# Altium integrated library Lib_MS_V4.0.IntLib: 296 symbols (part 2 of 2)
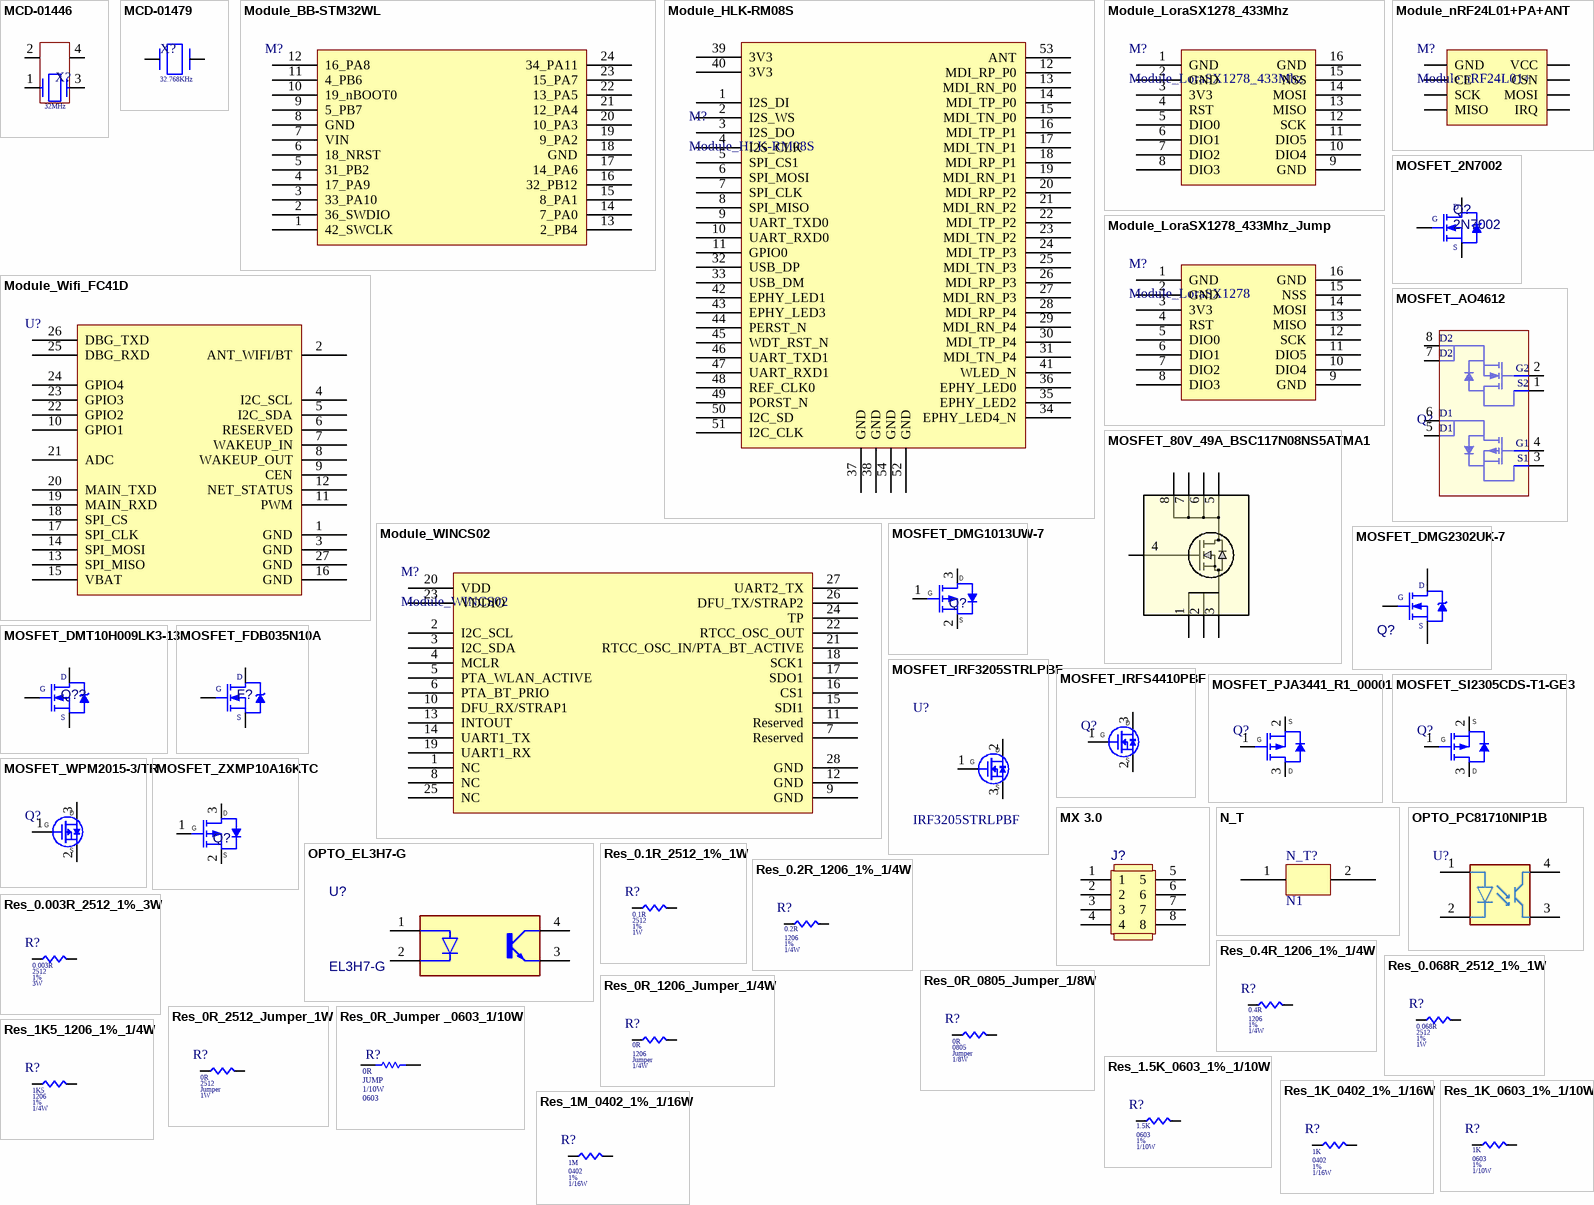
[diagram p10: symbols MCD-01446 to Res_1M_0402_1%_1/16W]

## Module_LoraSX1278_433Mhz
designator M?
Module RF SPI Lora SX1278 433MHz Ra-02 Ai-Thinker; ComponentLink1Description: CXT; ComponentLink1URL: https://linhkien.cxtvn.com/3446-module-wireless-sx1278-lora-ra-02-433mhz.html
footprint Module_LoraSX1278_433Mhz
pins: 1 GND, 2 GND, 3 3V3, 4 RST, 5 DIO0, 6 DIO1, 7 DIO2, 8 DIO3, 9 GND, 10 DIO4, 11 DIO5, 12 SCK, 13 MISO, 14 MOSI, 15 NSS, 16 GND

## Module_LoraSX1278_433Mhz_Jump
designator M?, comment Module_LoraSX1278
Module RF SPI Lora SX1278 433MHz Ra-02 Ai-Thinker with PCB; ComponentLink1Description: CXT; ComponentLink1URL: https://linhkien.cxtvn.com/11214-sx1278-lora-ra-02-ai-thinker-module-thu-phat-rf-spi-433mhz.html/page-1
footprint Module_LoraSX1278_433Mhz_JUMP
pins: 1 GND, 2 GND, 3 3V3, 4 RST, 5 DIO0, 6 DIO1, 7 DIO2, 8 DIO3, 9 GND, 10 DIO4, 11 DIO5, 12 SCK, 13 MISO, 14 MOSI, 15 NSS, 16 GND

## Module_nRF24L01+PA+ANT
designator M?, comment Module nRF24L01+
ComponentLink1Description: New link; ComponentLink1URL: https://lkcg.vn/mach-thu-phat-rf-nrf24l01-pa-lna-2-4ghz-anten-roi
footprint Module_nRF24L01+PA+ANT
pins: 1 GND, 2 VCC, 3 CE, 4 CSN, 5 SCK, 6 MOSI, 7 MISO, 8 IRQ

## Module_Wifi_FC41D
designator U?, comment FC41D  (value not drawn)
Wi-Fi & Bluetooth Module FC41D; ComponentLink1Description: DIGIKEY; ComponentLink1URL: https://www.digikey.com/en/products/detail/quectel/FC41DAHMD/21272527
footprint Module_Wifi_FC41D
pins: 1 GND, 2 ANT_WIFI/BT, 3 GND, 4 I2C_SCL, 5 I2C_SDA, 6 RESERVED, 7 WAKEUP_IN, 8 WAKEUP_OUT, 9 CEN, 10 GPIO1, 11 PWM, 12 NET_STATUS, 13 SPI_MISO, 14 SPI_MOSI, 15 VBAT, 16 GND, 17 SPI_CLK, 18 SPI_CS, 19 MAIN_RXD, 20 MAIN_TXD, 21 ADC, 22 GPIO2, 23 GPIO3, 24 GPIO4, 25 DBG_RXD, 26 DBG_TXD, 27 GND

## Module_WINCS02
designator M?
WiFi 802.11b/g/n Transceiver Module 2.4GHz Antenna Not Included, U.FL Surface Mount; ComponentLink1Description: New link; ComponentLink1URL: https://www.digikey.com/en/products/detail/microchip-technology/WINCS02UE-I-100/24617252
footprint MODULE_WINCS02UE
pins: 1 NC, 2 I2C_SCL, 3 I2C_SDA, 4 MCLR, 5 PTA_WLAN_ACTIVE, 6 PTA_BT_PRIO, 7 Reserved, 8 NC, 9 GND, 10 DFU_RX/STRAP1, 11 Reserved, 12 GND, 13 INTOUT, 14 UART1_TX, 15 SDI1, 16 CS1, 17 SDO1, 18 SCK1, 19 UART1_RX, 20 VDD, 21 RTCC_OSC_IN/PTA_BT_ACTIVE, 22 RTCC_OSC_OUT, 23 VDDIO, 24 TP, 25 NC, 26 DFU_TX/STRAP2, 27 UART2_TX, 28 GND

## MOSFET_2N7002
designator Q?, comment 2N7002
N-Channel 60 V 115mA (Ta) 200mW (Ta) Surface Mount SOT-23-3; Manufacturer: DIODES INC.; Part Number: 2N7002-7-F; Vdss: 60 V; Rds On (Max) @ Id, Vgs: 7.5Ohm @ 500mA, 10V; Package: SOT23-3; ComponentLink1Description: TGIC; ComponentLink1URL: https://www.thegioiic.com/2n7002-mosfet-kenh-n-60v-115ma-sot-23; ComponentLink2Description: DIGIKEY; ComponentLink2URL: https://www.digikey.bg/en/products/detail/onsemi/2N7002/244345; Id: 115mA; Sort: N-Channel
footprint MOSFET_2N7002_SOT-23-3
pins: 1 G, 2 S, 3 D

## MOSFET_80V_49A_BSC117N08NS5ATMA1
designator Q?, comment BSC117N08NS5ATMA1  (value not drawn)
N-Channel 80 V 49A (Tc) 2.5W (Ta), 50W (Tc) Surface Mount PG-TDSON-8-7; Manufacturer: Infineon; VDS: 80V; ComponentLink1Description: DIGIKEY; ComponentLink1URL: https://www.digikey.com/en/products/detail/infineon-technologies/BSC117N08NS5ATMA1/5959917; Id Max: 49A; Sort: N-Channel; Package: TDSON-8-7; Parameter 1: *
footprint MOSFET_BSC117N08NS5ATMA1
pins: 1, 2, 3, 4, 5, 6, 7, 8

## MOSFET_AO4612
designator Q?, comment AO4612  (value not drawn)
MOSFET N/P-CH 60V 4.5A 8SOIC; Manufacturer: Alpha & Omega Semiconductor Inc.; ComponentLink1Description: LKCL; ComponentLink1URL: https://linhkienchatluong.vn/fets/ao4612-dual-mosfet-np-60v-sop-8-chinh-hang-aos_sp589_ct15568.aspx; Part Number: AO4612; Vds: 60V; Id Max: 4.5A; Sort: N/P-CH; Package: 8-SOIC
footprint AO4612
pins: 1 S2, 2 G2, 3 S1, 4 G1, 5 D1, 6 D1, 7 D2, 8 D2

## MOSFET_DMG1013UW-7
designator Q?, comment DMG1013UW-7  (value not drawn)
P-Channel 20 V 820mA (Ta) 310mW (Ta) Surface Mount SOT-323; Manufacturer: DIODES INC.; Description SEL: MOSFET P-CH 20V 820MA SOT323; Vdss: 20V; Rds On (Max) @ Id, Vgs: 750mOhm @ 430mA, 4.5V; Gate Charge (Qg) (Max) @ Vgs: 0.622 nC @ 4.5 V; Part Number: DMG1013UW-7; Package: SOT-323; ComponentLink1Description: DIGIKEY; ComponentLink1URL: https://www.digikey.bg/en/products/detail/diodes-incorporated/DMG1013UW-7/2183241?s=N4IgTCBcDaICIFkDiBGADCgzAVQOoFoB2EAXQF8g; Id: 820mA; Sort: P-Channel
footprint MOSFET_DMG1013UW-7_SOT323
pins: 1 GATE, 2 SOURCE, 3 DRAIN
text: D; G; S

## MOSFET_DMG2302UK-7
designator Q?, comment DMG2302UK-7  (value not drawn)
MOSFET N-CH 20V 2.8A SOT23; Manufacturer: DIODE INC.; Sort: N-Channel; Rds On (Max) @ Id, Vgs: 90mOhm @ 3.6A, 4.5V; Qg Max: 2.8 nC @ 10 V; Part Number: DMG2302UK-7; Package: SOT23; Vds: 20V; ComponentLink1Description: New link; ComponentLink1URL: *; Id Max: 2.8A
footprint MOSFET_DMG2302UK-7
pins: 1 G, 2 S, 3 D

## MOSFET_DMT10H009LK3-13
designator Q??, comment DMT10H009LK3-13  (value not drawn)
N-Channel 100 V 90A (Tc) 1.7W (Ta) Surface Mount TO-252 (DPAK); Manufacturer: Diodes Incorporated; Voltage: 100V; Rds On (Max) @ Id, Vgs: 9mOhm @ 20A, 10V; Gate Charge (Qg) (Max) @ Vgs: 20 nC @ 4.5 V; Part Number: DMT10H009LK3-13; Current: 90A; Package: TO-252-3; Type: N-Channel; ComponentLink1Description: DIGIKEY; ComponentLink1URL: https://www.digikey.com/en/products/detail/diodes-incorporated/DMT10H009LK3-13/16547500?s=N4IgTCBcDaICIFkAqBGADACTWgnAGQGkBmAWhSJAF0BfIA
footprint MOSFET_DMT10H009LK3-13
pins: 1 G, 2 D, 3 S

## MOSFET_FDB035N10A
designator F?, comment FDB035N10A  (value not drawn)
N-Channel 100 V 120A (Tc) 333W (Tc) Surface Mount TO-263 (D2PAK); Manufacturer: onsemi; Vds: 100V; Rds On (Max) @ Id, Vgs: 3.5mOhm @ 75A, 10V; Gate Charge (Qg) (Max) @ Vgs: 116 nC @ 10 V; Part Number: FDB035N10A; ComponentLink1Description: DIGIKEY; ComponentLink1URL: https://www.digikey.com/en/products/detail/onsemi/FDB035N10A/2804157?s=N4IgTCBcDaIGIBEBCAGAzAVgHIEYUEEQBdAXyA; Id Max: 120A; Package: TO-263 (D2PAK); Sort: N-Channel
footprint MOSFET_FDB035N10A
pins: 1 G, 2 D, 3 S

## MOSFET_IRF3205STRLPBF
designator U?, comment IRF3205STRLPBF
MOSFET N-CH 55V 110A D2PAK; Manufacture: Infineon Technologies; Sort: N-Channel; Rds On (Max) @ Id, Vgs: 8mOhm @ 62A, 10V; Gate Charge (Qg) (Max) @ Vgs: 146 nC @ 10 V; ComponentLink1Description: LKCG; ComponentLink1URL: https://lkcg.vn/linh-kien-irf3205s-dip-to-220; ComponentLink2Description: DIGIKEY; ComponentLink2URL: https://www.digikey.bg/en/products/detail/infineon-technologies/IRF3205STRLPBF/856540; Manufacture Part Number: IRF3205STRLPBF; MSL: 1; Temperature: -40°C ~ 150°C; Vds: 55 V; Id: 110A
footprint MOSFET_IRF3205S
pins: 1 G, 2 D, 3 S

## MOSFET_IRFS4410PBF
designator Q?, comment IRFS4410PBF  (value not drawn)
N-Channel 100 V 88A (Tc) 200W (Tc) Surface Mount D2PAK; Manufacturer: Infineon Technologies; Vdss: 100 V; Rds On (Max) @ Id, Vgs: 10mOhm @ 58A, 10V; Gate Charge (Qg) (Max) @ Vgs: 180 nC @ 10 V; ComponentLink1Description: ICDR; ComponentLink1URL: https://icdayroi.com/irfs4410pbf; ComponentLink2Description: DIGIKEY; ComponentLink2URL: https://www.digikey.bg/en/products/detail/infineon-technologies/IRFS4410PBF/1827971?s=N4IgTCBcDaIJICUBiBlALGgjABgAoCEkACEAXQF8g; Part Number: IRFS4410PBF; Id: 88A; Sort: N-Channel
footprint MOSFET_IRFS4410PBF
pins: 1 G, 2 S, 3 D

## MOSFET_PJA3441_R1_00001
designator Q?, comment PJA3441_R1_00001  (value not drawn)
P-Channel 40 V 3.1A (Ta) 1.25W (Ta) Surface Mount SOT-23; Manufacturer: Panjit International Inc.; Vdss: 40 V; Rds On (Max) @ Id, Vgs: 88mOhm @ 3.1A, 10V; Gate Charge (Qg) (Max) @ Vgs: 6 nC @ 4.5 V; ComponentLink1Description: New link; ComponentLink1URL: https://www.digikey.bg/en/products/detail/panjit-international-inc/PJA3441-R1-00001/14660323; Part Number: PJA3441_R1_00001; Id: 3.1A; Sort: P-Channel; Package: SOT-23
footprint MOSFET_PJA3441_R1_00001
pins: 1 GATE, 2 SOURCE, 3 DRAIN
text: S; G; D

## MOSFET_SI2305CDS-T1-GE3
designator Q?, comment SI2305CDS-T1-GE3  (value not drawn)
P-Channel 8 V 5.8A (Tc) 960mW (Ta), 1.7W (Tc) Surface Mount SOT-23-3 (TO-236); Manufacturer: Vishay Siliconix; Vdss: 8V; Rds On (Max) @ Id, Vgs: 35mOhm @ 4.4A, 4.5V; Gate Charge (Qg) (Max) @ Vgs: 30 nC @ 8 V; ComponentLink1Description: New link; ComponentLink1URL: https://www.digikey.com/en/products/detail/vishay-siliconix/SI2305CDS-T1-GE3/2622024?s=N4IgTCBcDaIMoEkwGYAMBWAwgETgWgBUBGPAcQFFkQBdAXyA; Part Number: SI2305CDS-T1-GE3; Sort: P-Channel; Id: 5.8A; Package: SOT-23-3 (TO-236)
footprint MOSFET_SI2305CDS-T1-GE3
pins: 1 GATE, 2 SOURCE, 3 DRAIN
text: S; G; D

## MOSFET_WPM2015-3/TR
designator Q?, comment WPM2015-3/TR  (value not drawn)
20V 2.2A 800mW 110mΩ@4.5V,2.7A 810mV@250uA 1 Piece P-Channel SOT-23 MOSFETs ROHS; Manufacturer: WILLSEMI(Will Semicon); Id: 2.4A; Gate Charge(Qg): 7.3nC@4.5V; ComponentLink1Description: New link; ComponentLink1URL: https://jlcpcb.com/partdetail/WILLSEMI_Will_Semicon-WPM2015_3TR/C213159; Part Number: WPM2015-3/TR; Sort: P-Channel; Vdss: 20V; RDS(on): 110mΩ@4.5V,2.7A; Package: SOT-23
footprint MOSFET_WPM2015-3/TR
pins: 1 G, 2 S, 3 D

## MOSFET_ZXMP10A16KTC
designator Q?, comment ZXMP10A16KTC  (value not drawn)
P-Channel 100 V 3A (Ta) 2.15W (Ta) Surface Mount TO-252-3; Manufacturer: DIODES INC.; Part Number: IRFR9120NTRPBF; Vdss: 100V; Rds On (Max) @ Id, Vgs: 235mOhm @ 2.1A, 10V; Gate Charge (Qg) (Max) @ Vgs: 16.5 nC @ 10 V; Package: To252-3p; ComponentLink1Description: DIGIKEY; ComponentLink1URL: https://www.digikey.bg/en/products/detail/diodes-incorporated/ZXMP10A16KTC/1873878?s=N4IgTCBcDaIFoA0CyAFAjABgIJoGwGkAVAYRAF0BfIA; Sort: P-Channel; Id: 3A
footprint MOSFET_ZXMP10A16KTC
pins: 1 GATE, 2 SOURCE, 3 DRAIN
text: D; G; S

## MX 3.0
designator J?, comment 430450800  (value not drawn)
Part Number: MX 3.0mm; Value: RA/8P; Description SEL: Đầu Nối MX 3.0mm; ComponentLink1Description: CXT; ComponentLink1URL: https://linhkien.cxtvn.com/3373-dau-noi-mx30mm-2-hang-chan-duc-cong.html
footprint 430450800
pins: 1, 2, 3, 4, 5, 6, 7, 8

## N_T
designator N_T?, comment N1  (net tie, no BOM)
footprint NT
pins: 1, 2

## OPTO_EL3H7-G
designator U?, comment EL3H7-G
Optoisolator Transistor Output 3750Vrms 1 Channel 4-SSOP; Part Number: VOS617A-4T; Manufacturer: Everlight Electronics; Description SEL: OPTOISOLATOR 3.75KV TRANS 4-SSOP; Current - Output / Channel: 50mA; Voltage - Output (Max): 80V; Number of Channels: 1; ComponentLink1Description: TGIC; ComponentLink1URL: https://www.thegioiic.com/el3h7-optoisolator-transistor-output-3750vrms-1-channel-4-ssop; ComponentLink2Description: DIGIKEY; ComponentLink2URL: https://www.digikey.com/en/products/detail/everlight-electronics-co-ltd/EL3H7-G/2692941; Package: 4-SSOP
footprint OPTO_EL3H7-G
pins: 1 A, 2 C, 3 E, 4 CO

## OPTO_PC81710NIP1B
designator U?, comment PC81710NIP1B  (value not drawn)
OPTOISOLATOR 5KV 1CH TRANS 4-SMD; Manufacturer: SHARP/Socle Technology; Number of Channels: 1; Voltage - Output (Max): 80V; Current - Output / Channel: 50mA; ComponentLink1Description: BLK; ComponentLink1URL: https://banlinhkien.com/el817-sop4-opto-thay-the-pc817-smd-p6650626.html; ComponentLink2Description: DIGIKEY; ComponentLink2URL: https://www.digikey.com/en/products/detail/sharp-socle-technology/PC81710NIP1B/7798258; Part number: PC81710NIP1B; Package: 4-SMD
footprint PC817
pins: 1 ANODE, 2 CATHODE, 3 EMITTER, 4 COLLECTOR

## Res_0.1R_2512_1%_1W
designator R?, comment value 0.1R  Tolerance: 1%  Power: 1W  Package: 2512  (hidden comment: RL2512FK-070R1L)
RES 0.1 OHM 1% 1W 2512; ComponentLink1Description: CXT; ComponentLink1URL: https://linhkien.cxtvn.com/4866-dien-tro-2512-2w-1w-1-cac-gia-tri-day-5-chiec.html; ComponentLink2Description: DIGIKEY; ComponentLink2URL: https://www.digikey.com/en/products/detail/yageo/RL2512FK-070R1L/2827664?s=N4IgTCBcDaIAQCUAyYCsBGMAxA0gWgAYB2AhdJEAXQF8g
footprint Res_2512
pins: 1, 2

## Res_0.2R_1206_1%_1/4W
designator R?, comment value 0.2R  Power: 1/4W  Pakage: 1206  Tolerance: 1%  (hidden comment: WSL1206R2000FEB)
RES 0.2 OHM 1% 1/4W 1206; ComponentLink1Description: CXT; ComponentLink1URL: https://linhkien.cxtvn.com/11466-dien-tro-1206-1-thong-so-tu-0r-den-910r.html; ComponentLink2Description: DIGIKEY; ComponentLink2URL: https://www.digikey.com/en/products/detail/vishay-dale/WSL1206R2000FEB/9752677
footprint Res_1206
pins: 1, 2

## Res_0.003R_2512_1%_3W
designator R?, comment value 0.003R  Tolerance: 1%  Power: 3W  Package: 2512  (hidden comment: CRE2512-FZ-R003E-3)
3 mOhms ±1% 3W Chip Resistor 2512 (6432 Metric) Automotive AEC-Q200, Current Sense, Moisture Resistant Metal Element; ComponentLink1Description: MOUSER; ComponentLink1URL: https://www.mouser.vn/ProductDetail/Bourns/CRE2512-FZ-R003E-3?qs=rpfKl3ntHzPjkfGuk%252BIwsA%3D%3D
footprint Res_2512_3W_CRE2512-FZ-R003E-3
pins: 1, 2

## Res_0.4R_1206_1%_1/4W
designator R?, comment value 0.4R  Power: 1/4W  Pakage: 1206  Tolerance: 1%  (hidden comment: RL1206FR-7W0R4L)
RES 0.4 OHM 1% 1/4W 1206; ComponentLink1Description: MOUSER; ComponentLink1URL: https://www.mouser.vn/ProductDetail/YAGEO/RL1206FR-7W0R4L?qs=k2KEx2DUIRSMzNnaPb%252BF0w%3D%3D
footprint Res_1206
pins: 1, 2

## Res_0.068R_2512_1%_1W
designator R?, comment value 0.068R  Tolerance: 1%  Power: 1W  Package: 2512  (hidden comment: RL2512FK-070R068L)
RES 0.068 OHM 1% 1W 2512; ComponentLink1Description: DIGIKEY; ComponentLink1URL: https://www.digikey.com/en/products/detail/yageo/RL2512FK-070R068L/3885856
footprint Res_2512
pins: 1, 2

## Res_0R_0805_Jumper_1/8W
designator R?, comment value 0R  Tolerance: Jumper  Power: 1/8W  Package: 0805  (hidden comment: RC0805JR-070RL)
RES 0 OHM JUMPER 1/8W 0805; ComponentLink1Description: CXT; ComponentLink1URL: https://linhkien.cxtvn.com/2899-dien-tro-0805-1-thong-so-tu-0r-den-910r.html; ComponentLink2Description: DIGIKEY; ComponentLink2URL: https://www.digikey.com/en/products/detail/yageo/RC0805JR-070RL/728216
footprint Res_0805
pins: 1, 2

## Res_0R_1206_Jumper_1/4W
designator R?, comment value 0R  Power: 1/4W  Pakage: 1206  Tolerance: Jumper  (hidden comment: RC1206JR-070RL)
RES 0 OHM JUMPER 1/4W 1206; ComponentLink1Description: CXT; ComponentLink1URL: https://linhkien.cxtvn.com/3667-dien-tro-1206-1-thong-so-tu-0r-den-910r.html; ComponentLink2Description: DIGIKEY; ComponentLink2URL: https://www.digikey.com/en/products/detail/yageo/RC1206JR-070RL/729184
footprint Res_1206
pins: 1, 2

## Res_0R_2512_Jumper_1W
designator R?, comment value 0R  Tolerance: Jumper  Power: 1W  Package: 2512  (hidden comment: CR2512AJ/-000EAS)
0 Ohms Jumper Chip Resistor 2512 (6432 Metric) Anti-Sulfur, Automotive AEC-Q200, Moisture Resistant Thick Film; ComponentLink1Description: DIGIKEY; ComponentLink1URL: https://www.digikey.bg/en/products/detail/bourns-inc/CR2512AJ-000EAS/10240145?s=N4IgTCBcDaIE4FMDOACADHFYCsBGCAugL5A; ComponentLink2Description: LKD; ComponentLink2URL: https://banlinhkiendientu.vn/dien-tro-dan-2512-0r-r00-1w-5-day-10-chiec/
footprint Res_2512_3W_CRE2512-FZ-R003E-3
pins: 1, 2

## Res_0R_Jumper _0603_1/10W
designator R?, comment Resistance: 0R  Tolerance: JUMP  Power: 1/10W  Package: 0603  (hidden comment: RC0603JR-070RL)
RES 0 OHM JUMPER 1/10W 0603; Manufacture 1: YAGEOWalsin Technology Corporation; Mouting Type: SMD; Temp Coef: ±100ppm/°C; Manufacture Part Number 1: RC0603JR-070RL; MSL: 1; Temperature: -55°C ~ 155°C; Type: RES; ComponentLink1Description: CXT; ComponentLink1URL: https://linhkien.cxtvn.com/3833-dien-tro-0603-1-thong-so-tu-0r-den-910r.html; ComponentLink2Description: DIGIKEY; ComponentLink2URL: https://www.digikey.com/en/products/detail/yageo/RC0603JR-070RL/726675
footprint RESC1608X05N (Chip Resistor, 2-Leads, Body 1.60x0.80mm (0603))
pins: 1, 2

## Res_1.5K_0603_1%_1/10W
designator R?, comment value 1.5K  Power: 1/10W  Package: 0603  Tolerance: 1%  (hidden comment: 0603WAF1501T5E)
RES 1.5K OHM 1% 1/10W 0603; ComponentLink1Description: CXT; ComponentLink1URL: https://linhkien.cxtvn.com/5005-dien-tro-0603-1-thong-so-tu-1k-den-91k.html; ComponentLink2Description: DIGIKEY; ComponentLink2URL: https://www.mouser.vn/ProductDetail/Royalohm/0603WAF1501T5E?qs=e8oIoAS2J1TWOCRo0oO1xg%3D%3D
footprint RESC1608X05N (Chip Resistor, 2-Leads, Body 1.60x0.80mm (0603))
pins: 1, 2

## Res_1K5_1206_1%_1/4W
designator R?, comment value 1K5  Tolerance: 1%  Power: 1/4W  Package: 1206  (hidden comment: CRGCQ1206F1K5)
RES 1.5K OHM 1% 1/4W 1206; ComponentLink2Description: CXT; ComponentLink2URL: https://linhkien.cxtvn.com/3351-dien-tro-1206-5-thong-so-tu-1k-den-91k.html; ComponentLink3Description: DIGIKEY; ComponentLink3URL: https://www.digikey.bg/en/products/detail/te-connectivity-passive-product/CRGCQ1206F1K5/8576414
footprint Res_1206
pins: 1, 2

## Res_1K_0402_1%_1/16W
designator R?, comment value 1K  Power: 1/16W  Tolerance: 1%  Pakage: 0402  (hidden comment: RC0402FR-071KL)
RES 1K OHM 1% 1/16W 0402; ComponentLink1Description: CXT; ComponentLink1URL: https://linhkien.cxtvn.com/3454-dien-tro-0402-1-thong-so-tu-1k-den-91k.html; ComponentLink2Description: DIGIKEY; ComponentLink2URL: https://www.digikey.bg/en/products/detail/yageo/RC0402FR-071KL/726513?s=N4IgTCBcDaIEoGEAMAWJYBicC0SDsAjANIAyIAugL5A
footprint RES_0402
pins: 1, 2

## Res_1K_0603_1%_1/10W
designator R?, comment value 1K  Power: 1/10W  Pakage: 0603  Tolerance: 1%  (hidden comment: RC0603FR-071KL)
RES 1K OHM 1% 1/10W 0603; ComponentLink1Description: New link; ComponentLink1URL: https://linhkien.cxtvn.com/1424-dien-tro-0603-1-thong-so-tu-1k-den-91k.html; ComponentLink2Description: New link 1; ComponentLink2URL: https://www.digikey.bg/en/products/detail/yageo/RC0603FR-071KL/726843
footprint RESC1608X05N (Chip Resistor, 2-Leads, Body 1.60x0.80mm (0603))
pins: 1, 2

## Res_1M_0402_1%_1/16W
designator R?, comment value 1M  Power: 1/16W  Tolerance: 1%  Pakage: 0402  (hidden comment: RC0402FR-071ML)
RES 1M OHM 1% 1/16W 0402; ComponentLink1Description: CXT; ComponentLink1URL: https://linhkien.cxtvn.com/2940-dien-tro-0402-1-thong-so-tu-1m-den-10m.html; ComponentLink2Description: DIGIKEY; ComponentLink2URL: https://www.digikey.bg/en/products/detail/yageo/RC0402FR-071ML/726515
footprint RES_0402
pins: 1, 2

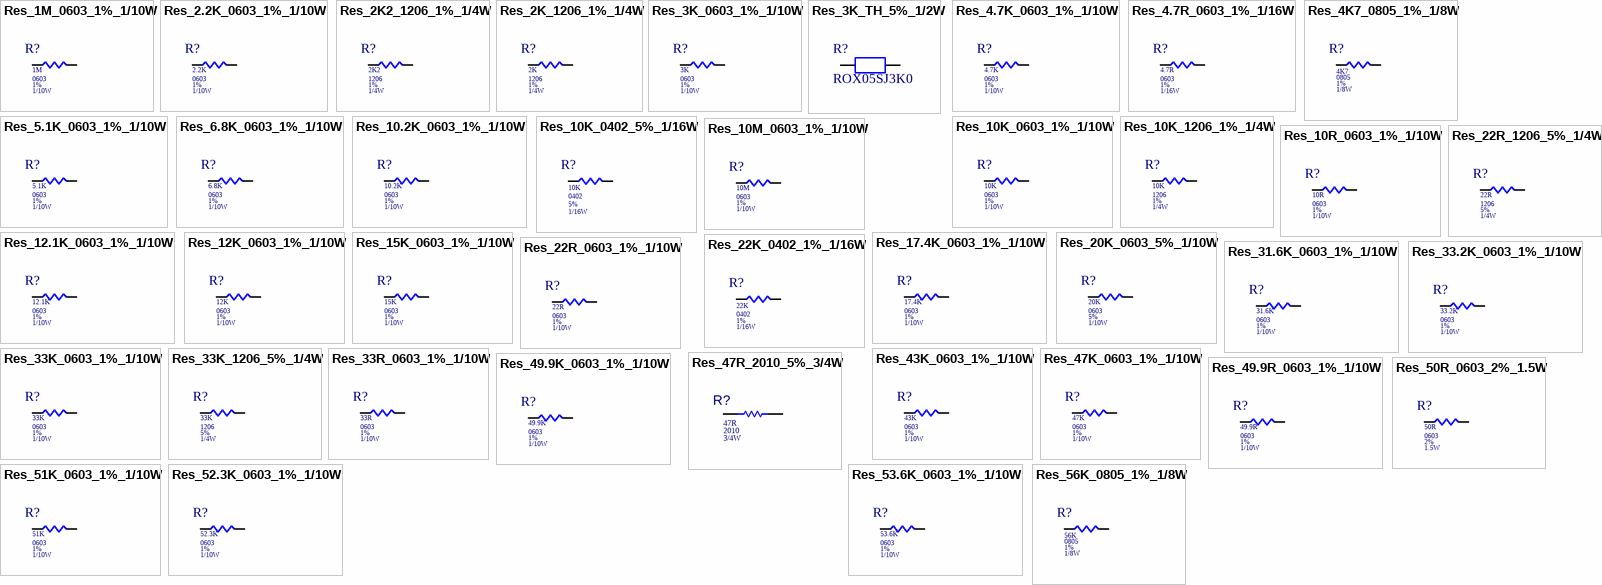
[diagram p7: symbols Res_1M_0603_1%_1/10W to Res_56K_0805_1%_1/8W]

## Res_1M_0603_1%_1/10W
designator R?, comment value 1M  Power: 1/10W  Pakage: 0603  Tolerance: 1%  (hidden comment: RC0603FR-071ML)
RES 1M OHM 1% 1/10W 0603; ComponentLink1Description: CXT; ComponentLink1URL: https://linhkien.cxtvn.com/2390-dien-tro-0603-1-thong-so-tu-1m-den-10m.html; ComponentLink2Description: DIGIKEY; ComponentLink2URL: https://www.digikey.com/en/products/detail/yageo/RC0603FR-071ML/726844
footprint RESC1608X05N (Chip Resistor, 2-Leads, Body 1.60x0.80mm (0603))
pins: 1, 2

## Res_2.2K_0603_1%_1/10W
designator R?, comment value 2.2K  Power: 1/10W  Pakage: 0603  Tolerance: 1%  (hidden comment: RMCF0603FT2K20)
RES 2.2K OHM 1% 1/10W 0603; ComponentLink1Description: CXT; ComponentLink1URL: https://linhkien.cxtvn.com/3649-dien-tro-0603-1-thong-so-tu-1k-den-91k.html; ComponentLink2Description: DIGIKEY; ComponentLink2URL: https://www.digikey.com/en/products/detail/stackpole-electronics-inc/RMCF0603FT2K20/1760987
footprint RESC1608X05N (Chip Resistor, 2-Leads, Body 1.60x0.80mm (0603))
pins: 1, 2

## Res_2K2_1206_1%_1/4W
designator R?, comment value 2K2  Power: 1/4W  Pakage: 1206  Tolerance: 1%  (hidden comment: RMCF1206FT2K20)
RES 2.2K OHM 1% 1/4W 1206; ComponentLink1Description: CXT; ComponentLink1URL: https://linhkien.cxtvn.com/4144-dien-tro-1206-1-thong-so-tu-1k-den-910k.html; ComponentLink2Description: DIGIKEY; ComponentLink2URL: https://www.digikey.bg/en/products/detail/stackpole-electronics-inc/RMCF1206FT2K20/1759713
footprint Res_1206
pins: 1, 2

## Res_2K_1206_1%_1/4W
designator R?, comment value 2K  Power: 1/4W  Pakage: 1206  Tolerance: 1%  (hidden comment: RMCF1206FT2K00)
RES 2K OHM 1% 1/4W 1206; ComponentLink1Description: CXT; ComponentLink1URL: https://linhkien.cxtvn.com/3352-dien-tro-1206-5-thong-so-tu-1k-den-91k.html; ComponentLink2Description: DIGIKEY; ComponentLink2URL: https://www.digikey.bg/en/products/detail/stackpole-electronics-inc/RMCF1206FT2K00/1759723
footprint Res_1206
pins: 1, 2

## Res_3K_0603_1%_1/10W
designator R?, comment value 3K  Power: 1/10W  Pakage: 0603  Tolerance: 1%  (hidden comment: RMCF0603FT3K00)
3 kOhms ±1% 0.1W, 1/10W Chip Resistor 0603 (1608 Metric) Automotive AEC-Q200 Thick Film; ComponentLink1Description: LKCL; ComponentLink1URL: https://linhkienchatluong.vn/dien-tro-dan-0603-116w-1/dien-tro-dan-0603-3k-1-50c_sp836_ct11748.aspx; ComponentLink2Description: DIGIKEY; ComponentLink2URL: https://www.digikey.bg/en/products/detail/stackpole-electronics-inc/RMCF0603FT3K00/1713988
footprint RESC1608X05N (Chip Resistor, 2-Leads, Body 1.60x0.80mm (0603))
pins: 1, 2

## Res_3K_TH_5%_1/2W
designator R?, comment ROX05SJ3K0
3 kOhms ±5% 0.5W, 1/2W Through Hole Resistor Axial Flame Proof, Pulse Withstanding, Safety Metal Oxide Film; Manufacturer: TE Connectivity Passive Product; Value: 3K; Part Number: ROX05SJ3K0; Tolerance: 5%; Power: 1/2W; Dimension: 2.50mm x 7.50mm; ComponentLink1Description: New link; ComponentLink1URL: *; ComponentLink2Description: DIGIKEY; ComponentLink2URL: https://www.digikey.bg/en/products/detail/te-connectivity-passive-product/ROX05SJ3K0/9926141
footprint RES_TH_1/2W
pins: 1, 2

## Res_4.7K_0603_1%_1/10W
designator R?, comment value 4.7K  Power: 1/10W  Pakage: 0603  Tolerance: 1%  (hidden comment: RC0603FR-074K7L)
RES 4.7K OHM 1% 1/10W 0603; ComponentLink1Description: CXT; ComponentLink1URL: https://linhkien.cxtvn.com/2398-dien-tro-0603-1-thong-so-tu-1k-den-91k.html; ComponentLink2Description: DIGIKEY; ComponentLink2URL: https://www.digikey.com/en/products/detail/yageo/RC0603FR-074K7L/727212
footprint RESC1608X05N (Chip Resistor, 2-Leads, Body 1.60x0.80mm (0603))
pins: 1, 2

## Res_4.7R_0603_1%_1/16W
designator R?, comment value 4.7R  Power: 1/16W  Pakage: 0603  Tolerance: 1%  (hidden comment: RN73G1JTD4R70D)
RES SMD_4.7R_0.5%_1/16W, 0.625W; ComponentLink1Description: CXT; ComponentLink1URL: https://linhkien.cxtvn.com/2259-dien-tro-0603-1-thong-so-tu-0r-den-910r.html; ComponentLink2Description: DIGIKEY; ComponentLink2URL: https://www.digikey.com/en/products/detail/meritek/RN73G1JTD4R70D/16549473?s=N4IgTCBcDaIEoFEDKACALAOgOxxQBgDY8BmEAXQF8g
footprint RESC1608X05N (Chip Resistor, 2-Leads, Body 1.60x0.80mm (0603))
pins: 1, 2

## Res_4K7_0805_1%_1/8W
designator R?, comment value 4K7  Tolerance: 1%  Power: 1/8W  Package: 0805  (hidden comment: CRCW08054K70FKEAC)
4.7 kOhms ±1% 0.125W, 1/8W Chip Resistor 0805 (2012 Metric) Thick Film; ComponentLink1Description: CXT; ComponentLink1URL: https://linhkien.cxtvn.com/2349-dien-tro-0805-1-thong-so-tu-1k-den-91k.html; ComponentLink2Description: DIGIKEY; ComponentLink2URL: https://www.digikey.com/en/products/detail/vishay-dale/CRCW08054K70FKEAC/7928553
footprint Res_0805
pins: 1, 2

## Res_5.1K_0603_1%_1/10W
designator R?, comment value 5.1K  Power: 1/10W  Pakage: 0603  Tolerance: 1%  (hidden comment: RMCF0603FT5K10)
5.1 kOhms ±1% 0.1W, 1/10W Chip Resistor 0603 (1608 Metric) Automotive AEC-Q200 Thick Film; ComponentLink1Description: CXT; ComponentLink1URL: https://linhkien.cxtvn.com/2291-dien-tro-0603-1-thong-so-tu-1k-den-91k.html; ComponentLink2Description: DIGIKEY; ComponentLink2URL: https://www.digikey.bg/en/products/detail/stackpole-electronics-inc/RMCF0603FT5K10/1760908?s=N4IgTCBcDaIEoFkDCAxADANjQZhQFQFYBpARjRAF0BfIA
footprint RESC1608X05N (Chip Resistor, 2-Leads, Body 1.60x0.80mm (0603))
pins: 1, 2

## Res_6.8K_0603_1%_1/10W
designator R?, comment value 6.8K  Power: 1/10W  Pakage: 0603  Tolerance: 1%  (hidden comment: RC0603FR-106K8L)
6.8 kOhms ±1% 0.1W, 1/10W Chip Resistor 0603 (1608 Metric) Thick Film; ComponentLink1Description: CXT; ComponentLink1URL: https://linhkien.cxtvn.com/5034-dien-tro-0603-1-thong-so-tu-1k-den-91k.html; ComponentLink2Description: DIGIKEY; ComponentLink2URL: https://www.digikey.bg/en/products/detail/yageo/RC0603FR-106K8L/14008237
footprint RESC1608X05N (Chip Resistor, 2-Leads, Body 1.60x0.80mm (0603))
pins: 1, 2

## Res_10.2K_0603_1%_1/10W
designator R?, comment value 10.2K  Power: 1/10W  Package: 0603  Tolerance: 1%  (hidden comment: RC0603FR-1310K2L)
RES 10.2K OHM 1% 1/10W 0603; ComponentLink1Description: CXT; ComponentLink1URL: https://linhkien.cxtvn.com/4622-dien-tro-0603-1-thong-so-tu-1k-den-91k.html; ComponentLink2Description: DIGIKEY; ComponentLink2URL: https://www.digikey.bg/en/products/detail/yageo/RC0603FR-07560RL/727304
footprint RESC1608X05N (Chip Resistor, 2-Leads, Body 1.60x0.80mm (0603))
pins: 1, 2

## Res_10K_0402_5%_1/16W
designator R?, comment value 10K  Power: 1/16W  Tolerance: 5%  Pakage: 0402  (hidden comment: RC0402JR-0710KL)
RES 10K OHM 5% 1/16W 0402; ComponentLink1Description: CXT; ComponentLink1URL: https://linhkien.cxtvn.com/2824-dien-tro-10k-0402-5-50c.html; ComponentLink2Description: DIGIKEY; ComponentLink2URL: https://www.digikey.com/en/products/detail/yageo/RC0402JR-0710KL/726418
footprint RES_0402
pins: 1, 2

## Res_10K_0603_1%_1/10W
designator R?, comment value 10K  Power: 1/10W  Package: 0603  Tolerance: 1%  (hidden comment: RC0603FR-0710KL)
RES 10K OHM 1% 1/10W 0603; ComponentLink1Description: CXT; ComponentLink1URL: https://linhkien.cxtvn.com/1422-dien-tro-0603-1-thong-so-tu-1k-den-91k.html; ComponentLink2Description: DIGIKEY; ComponentLink2URL: https://www.digikey.com/en/products/detail/yageo/RC0603FR-0710KL/726880?s=N4IgTCBcDaIEoGEAMA2JBmAYnAtEg7AIxIDSAMiALoC%2BQA
footprint RESC1608X05N (Chip Resistor, 2-Leads, Body 1.60x0.80mm (0603))
pins: 1, 2

## Res_10K_1206_1%_1/4W
designator R?, comment value 10K  Power: 1/4W  Pakage: 1206  Tolerance: 1%  (hidden comment: RC1206FR-0710KL)
RES 10K OHM 1% 1/4W 1206; ComponentLink1Description: CXT; ComponentLink1URL: https://linhkien.cxtvn.com/2656-dien-tro-1206-1-thong-so-tu-1k-den-910k.html; ComponentLink2Description: DIGIKEY; ComponentLink2URL: https://www.digikey.bg/en/products/detail/yageo/RC1206FR-0710KL/728483
footprint Res_1206
pins: 1, 2

## Res_10M_0603_1%_1/10W
designator R?, comment value 10M  Power: 1/10W  Pakage: 0603  Tolerance: 1%  (hidden comment: WR06W1005FTL)
10 MOhms ±1% 0.1W, 1/10W Chip Resistor 0603 (1608 Metric) Thick Film; ComponentLink1Description: LKCL; ComponentLink1URL: https://linhkienchatluong.vn/dien-tro-dan-0603-116w-1/dien-tro-dan-0603-10m-1-01f-50c_sp836_ct8446.aspx; ComponentLink2Description: DIGIKEY; ComponentLink2URL: https://www.digikey.bg/en/products/detail/walsin-technology-corporation/WR06W1005FTL/13243162?s=N4IgTCBcDaIOoCUAMA2OBGJSCsAxAKgDIgC6AvkA
footprint RESC1608X05N (Chip Resistor, 2-Leads, Body 1.60x0.80mm (0603))
pins: 1, 2

## Res_10R_0603_1%_1/10W
designator R?, comment value 10R  Power: 1/10W  Pakage: 0603  Tolerance: 1%  (hidden comment: RMCF0603FT10R0)
RES 10 OHM 1% 1/10W 0603; ComponentLink1Description: CXT; ComponentLink1URL: https://linhkien.cxtvn.com/2391-dien-tro-0603-1-thong-so-tu-0r-den-910r.html; ComponentLink2Description: DIGIKEY; ComponentLink2URL: https://www.digikey.com/en/products/detail/stackpole-electronics-inc/RMCF0603FT10R0/1761152
footprint RESC1608X05N (Chip Resistor, 2-Leads, Body 1.60x0.80mm (0603))
pins: 1, 2

## Res_12.1K_0603_1%_1/10W
designator R?, comment value 12.1K  Power: 1/10W  Package: 0603  Tolerance: 1%  (hidden comment: 0603WAF1212T5E)
RES 12.1K OHM 1% 1/10W 0603; ComponentLink1Description: CXT; ComponentLink1URL: https://linhkien.cxtvn.com/7742-dien-tro-0603-1-thong-so-tu-1k-den-91k.html; ComponentLink2Description: MOUSER; ComponentLink2URL: https://www.mouser.vn/ProductDetail/Royalohm/0603WAF1212T5E?qs=e8oIoAS2J1QOf5tSbOLY6A%3D%3D
footprint RESC1608X05N (Chip Resistor, 2-Leads, Body 1.60x0.80mm (0603))
pins: 1, 2

## Res_12K_0603_1%_1/10W
designator R?, comment value 12K  Power: 1/10W  Package: 0603  Tolerance: 1%  (hidden comment: RMCF0603FT12K0)
12 kOhms ±1% 0.1W, 1/10W Chip Resistor 0603 (1608 Metric) Automotive AEC-Q200 Thick Film; ComponentLink1Description: CXT; ComponentLink1URL: https://linhkien.cxtvn.com/4536-dien-tro-0603-1-thong-so-tu-1k-den-91k.html; ComponentLink2Description: DIGIKEY; ComponentLink2URL: https://www.digikey.com/en/products/detail/stackpole-electronics-inc/RMCF0603FT12K0/1761297
footprint RESC1608X05N (Chip Resistor, 2-Leads, Body 1.60x0.80mm (0603))
pins: 1, 2

## Res_15K_0603_1%_1/10W
designator R?, comment value 15K  Power: 1/10W  Pakage: 0603  Tolerance: 1%  (hidden comment: RMCF0603FT15K0)
15 kOhms ±1% 0.1W, 1/10W Chip Resistor 0603 (1608 Metric) Automotive AEC-Q200 Thick Film; ComponentLink1Description: CXT; ComponentLink1URL: https://linhkien.cxtvn.com/7715-dien-tro-0603-1-thong-so-tu-1k-den-91k.html; ComponentLink2Description: DIGIKEY; ComponentLink2URL: https://www.digikey.bg/en/products/detail/stackpole-electronics-inc/RMCF0603FT15K0/1760774
footprint RESC1608X05N (Chip Resistor, 2-Leads, Body 1.60x0.80mm (0603))
pins: 1, 2

## Res_17.4K_0603_1%_1/10W
designator R?, comment value 17.4K  Power: 1/10W  Package: 0603  Tolerance: 1%  (hidden comment: ERJ-3EKF1742V)
RES SMD 17.4K OHM 1% 1/10W 0603; ComponentLink1Description: CXT; ComponentLink1URL: https://linhkien.cxtvn.com/7311-dien-tro-0603-1-thong-so-tu-1k-den-91k.html; ComponentLink2Description: DIGIKEY; ComponentLink2URL: https://www.digikey.com/en/products/detail/panasonic-electronic-components/ERJ-3EKF1742V/196159
footprint RESC1608X05N (Chip Resistor, 2-Leads, Body 1.60x0.80mm (0603))
pins: 1, 2

## Res_20K_0603_5%_1/10W
designator R?, comment value 20K  Power: 1/10W  Package: 0603  Tolerance: 5%  (hidden comment: CRCW060320K0JNEAC)
20 kOhms ±5% 0.1W, 1/10W Chip Resistor 0603 (1608 Metric) Thick Film; ComponentLink2Description: CXT; ComponentLink2URL: https://linhkien.cxtvn.com/5973-dien-tro-0603-1-thong-so-tu-1k-den-91k.html; ComponentLink3Description: DIGIKEY; ComponentLink3URL: https://www.digikey.bg/en/products/detail/vishay-dale/CRCW060320K0JNEAC/7925426?s=N4IgTCBcDaIMICU4HUAMA2VBmMqDSqAUgHICiAgnCALoC%2BQA
footprint RESC1608X05N (Chip Resistor, 2-Leads, Body 1.60x0.80mm (0603))
pins: 1, 2

## Res_22K_0402_1%_1/16W
designator R?, comment value 22K  Power: 1/16W  Tolerance: 1%  Pakage: 0402  (hidden comment: RC0402FR-0722KL)
RES 22K OHM 1% 1/16W 0402; ComponentLink1Description: CXT; ComponentLink1URL: https://linhkien.cxtvn.com/7738-dien-tro-0402-1-thong-so-tu-1k-den-91k.html; ComponentLink2Description: DIGIKEY; ComponentLink2URL: https://www.digikey.bg/en/products/detail/yageo/RC0402FR-0722KL/726561?s=N4IgTCBcDaIEoGEAMAWJYBicC0SDsYYA0gDIgC6AvkA
footprint RES_0402
pins: 1, 2

## Res_22R_0603_1%_1/10W
designator R?, comment value 22R  Power: 1/10W  Pakage: 0603  Tolerance: 1%  (hidden comment: RMCF0603FT22R0)
22 Ohms ±1% 0.1W, 1/10W Chip Resistor 0603 (1608 Metric) Automotive AEC-Q200 Thick Film; ComponentLink1Description: CXT; ComponentLink1URL: https://linhkien.cxtvn.com/4435-dien-tro-0603-1-thong-so-tu-0r-den-910r.html; ComponentLink2Description: DIGIKEY; ComponentLink2URL: https://www.digikey.bg/en/products/detail/stackpole-electronics-inc/RMCF0603FT22R0/1760726
footprint RESC1608X05N (Chip Resistor, 2-Leads, Body 1.60x0.80mm (0603))
pins: 1, 2

## Res_22R_1206_5%_1/4W
designator R?, comment value 22R  Power: 1/4W  Pakage: 1206  Tolerance: 5%  (hidden comment: RC1206JR-0722RL)